# Altium footprint library General.PcbLib: 446 footprints (part 16 of 28)
Each footprint in its own frame and in the unit in brackets; x right, y up, seen from the top. Pads: shape width x height; smd on the part's side, far side on the other; paste and mask are expansions set on the pad; w line width, h text height; cw(c..) or ccw(c..) is an arc to the next point about the centre after c.
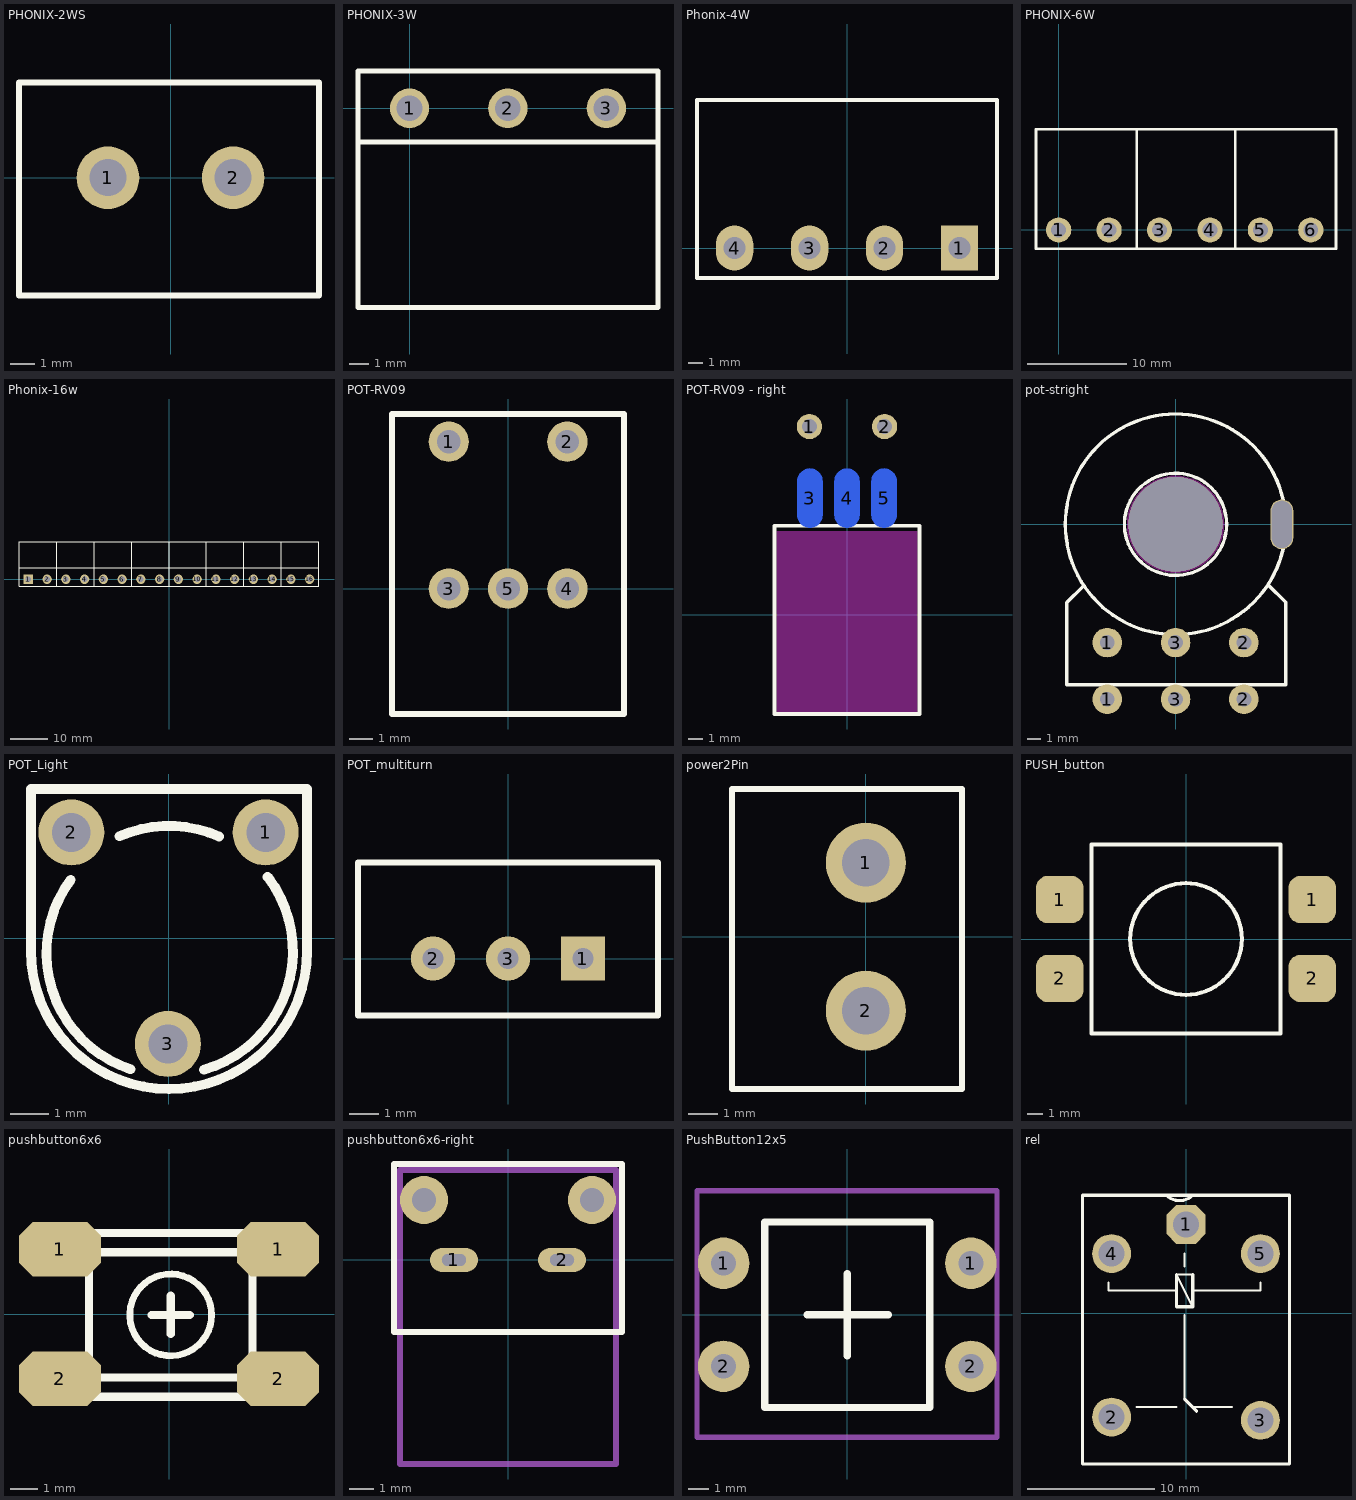
[diagram p15: the footprints below, top view; thin cyan lines are the x and y axes]

## PHONIX-2WS [mm] "stright"
pads (2):
  round 2.54 hole 1.5: 1(-2.54,0) 2(2.54,0)
Top Overlay:
  lines w0.254: -6.147,-4.775 -6.147,3.861 6.02,3.861 6.02,-4.775 -6.147,-4.775
3D body "phonix2w.stp": height 12, standoff -3.9, extent -6.089,-4.764 6.071,3.836

## PHONIX-3W [mm]
pads (3):
  round 2 hole 1.3: 1(0,0) 2(5,0) 3(10,0)
Top Overlay:
  lines w0.254: -2.616,-1.727 -2.616,-1.702 12.624,-1.702 ; -2.616,-10.109 12.624,-10.109 12.624,1.905 -2.616,1.905 -2.616,-10.109
3D body "User Library-Phoenix Contact MSTB-2_5_3G.STEP": height 8.7, standoff -3.4, extent -2.62,-10.1 12.62,1.9

## Phonix-4W [mm] "green2 part"
pads (4):
  rect 2.54x3.048 hole 1.5: 1(7.62,0)
  oval 2.54x3.048 hole 1.5: 2(2.54,0) 3(-2.54,0) 4(-7.62,0)
Top Overlay:
  lines w0.254: -10.16,-2.032 -10.16,10.033 10.16,10.033 10.16,-2.032 -10.16,-2.032
3D body "User Library-Green 4w Socket 5_08mm.step": height 16.1, standoff 0.5, extent -10.12,1.539 10.12,19.939
3D body "User Library-MSTB 2,5-4-G-5,08 1759033.STEP": height 8.6, standoff -3.5, extent -10.16,-1.969 10.16,10.033

## PHONIX-6W [mm]
pads (6):
  round 2.54 hole 1.5: 1(0,0) 2(5.08,0) 3(10.16,0) 4(15.24,0) 5(20.32,0) 6(25.4,0)
Top Overlay:
  lines w0.254: 7.874,-1.905 7.874,10.16 ; 17.78,-1.905 17.78,10.16 ; -2.286,-1.905 -2.286,10.16 27.94,10.16 27.94,-1.905 -2.159,-1.905 -2.286,-1.905
3D body "User Library-MSTB 2,5-2-G 1754436.STEP": height 3, standoff -9.1, extent 17.831,-1.936 27.831,10.064
3D body "User Library-MSTB 2,5-2-G 1754436.STEP": height 3, standoff -9.1, extent 7.823,-1.936 17.823,10.064
3D body "User Library-MSTB 2,5-2-G 1754436.STEP": height 3, standoff -9.1, extent -2.177,-1.936 7.823,10.064

## Phonix-16w [mm]
pads (16):
  rect 2.54x2.54 hole 1.5: 1(-38.1,0)
  round 2.54 hole 1.5: 2(-33.02,0) 3(-27.94,0) 4(-22.86,0) 5(-17.78,0) 6(-12.7,0) 7(-7.62,0) 8(-2.54,0) 9(2.54,0) 10(7.62,0) 11(12.7,0) 12(17.78,0) 13(22.86,0) 14(27.94,0) 15(33.02,0) 16(38.1,0)
Top Overlay:
  lines w0.254: -40.64,3.175 40.64,3.175 ; -30.48,-1.905 -30.48,10.16 ; -20.32,-1.905 -20.32,10.16 ; -10.16,-1.905 -10.16,10.16 ; 0,-1.905 0,10.16 ; 10.16,-1.905 10.16,10.16 ; 20.32,-1.905 20.32,10.16 ; 30.48,-1.905 30.48,10.16 ; -40.64,-1.905 40.64,-1.905 40.64,10.16 -40.64,10.16 -40.64,-1.905
3D body "User Library-MSTB 2,5-2-G 1754436.STEP": height 3, standoff -9.1, extent -20.211,-1.936 -10.211,10.064
3D body "User Library-MSTB 2,5-2-G 1754436.STEP": height 3, standoff -9.1, extent -30.353,-1.961 -20.353,10.039
3D body "User Library-MSTB 2,5-2-G 1754436.STEP": height 3, standoff -9.1, extent -40.513,-1.961 -30.513,10.039
3D body "User Library-MSTB 2,5-2-G 1754436.STEP": height 3, standoff -9.1, extent 10.218,-1.936 20.218,10.064
3D body "User Library-MSTB 2,5-2-G 1754436.STEP": height 3, standoff -9.1, extent 0.055,-1.956 10.055,10.044
3D body "User Library-MSTB 2,5-2-G 1754436.STEP": height 3, standoff -9.1, extent -10.051,-1.961 -0.051,10.039
3D body "User Library-MSTB 2,5-2-G 1754436.STEP": height 3, standoff -9.1, extent 30.607,-1.936 40.607,10.064
3D body "User Library-MSTB 2,5-2-G 1754436.STEP": height 3, standoff -9.1, extent 20.429,-1.936 30.429,10.064

## POT-RV09 [mm]
pads (5):
  round 1.7 hole 1: 1(-2.5,6.2) 2(2.5,6.2) 3(-2.5,0) 4(2.5,0) 5(0,0)
Top Overlay:
  lines w0.254: -4.891,-5.283 -4.891,7.366 4.888,7.366 4.888,-5.283 -4.891,-5.283
3D body "Potentiometerquad-09-1.STEP": height 11.35, standoff -3.5, extent -4.742,-19.934 4.763,7.366

## POT-RV09 - right [mm]
pads (5):
  round 1.7 hole 1: 1(-2.54,12.7) 2(2.54,12.7)
  oval 1.7x4 smd far side: 3(-2.5,7.875) 4(0,7.875) 5(2.5,7.875)
Top Overlay:
  lines w0.254: -4.9,-6.7 -4.9,6 4.9,6 4.9,-6.7 -4.9,-6.7
Keep-Out Layer:
  board cut-out: -4.75,-6.6 4.75,-6.6 4.75,5.625 -4.75,5.625
3D body "Potentiometerquad-09-1.STEP": height 6.7, standoff -20.6, extent -4.73,-5.367 4.775,9.483

## pot-stright [mm]
pads (7):
  round 2.2 hole 1.1: 1(-5.08,-13) 1(-5.08,-8.79) 2(5.08,-13) 2(5.08,-8.79) 3(0,-13) 3(0,-8.79)
  oval 1.7x3.7 hole 1.5 slot 3.5 at 90 deg: ""(7.9,0)
via 0,0 diameter 7 hole 7
Top Overlay:
  circle w0.254: c0,0 r8.2
  circle w0.254: c0,0 r3.8
  lines w0.254: -6.833,-4.593 -6.858,-4.593 -8.077,-5.812 -8.077,-11.933 8.179,-11.933 8.179,-5.786 6.871,-4.478
Keep-Out Layer:
  circle w0.254: c0,0 r3.5
3D body "Potentiometer-3.step": height 9, standoff -19.7, extent -8.424,-16.72 8.576,8.264
3D body "header-5.08-3w .stp": height 15.12, standoff -3.93, extent -7.495,-11.965 7.495,-5.615

## POT_Light [mm]
pads (3):
  round 1.7 hole 1: 1(2.502,2.722) 2(-2.502,2.722)
  round 1.7 hole 1 paste+0: 3(-0.014,-2.722)
Top Overlay:
  lines w0.254: -2.516,1.505 ccw(c0.014,-0.379) -0.978,-3.374 ; -1.269,2.623 cw(c0.013,-0.326) 1.304,2.619 ; 0.91,-3.385 ccw(c0.036,-0.341) 2.553,1.579 ; -3.543,-0.326 ccw(c0.013,-0.326) 3.569,-0.326 3.569,3.23 3.569,3.84 -3.543,3.84 -3.543,3.23 -3.543,-0.326
3D body "User Library-Trimmer, 3306F-1.STEP": height 7.62, standoff -3.04, extent -3.354,-3.35 3.456,4.902

## POT_multiturn [mm]
pads (3):
  rect 1.5x1.5 hole 0.7: 1(2.54,0)
  round 1.5 hole 0.7: 2(-2.54,0) 3(0,0)
Top Overlay:
  lines w0.2: -5.08,-1.93 -5.08,0 -5.08,3.251 5.08,3.251 5.08,-1.93 -5.08,-1.93
3D body "User Library-multi turn.step": height 12.57, standoff -2.16, extent -5.08,-1.93 5.08,3.15

## power2Pin [mm]
pads (2):
  round 2.7 hole 1.6: 1(0,2.5) 2(0,-2.5)
Top Overlay:
  lines w0.2: -4.521,-5.145 -4.521,4.989 3.251,4.989 3.251,-5.145 -4.521,-5.145
3D body "2-pin terminal block 5_0mm.step": height 10, standoff -3.5, extent -4.377,-5.685 3.073,4.995

## PUSH_button [mm] "12x12 smd flat"
pads (4):
  rrect50% 3x3 smd: 1(-8,2.5) 1(8,2.5) 2(-8,-2.5) 2(8,-2.5)
Top Overlay:
  circle w0.254: c0,0 r3.536
  lines w0.254: -6,-6 6,-6 6,6 -6,6 -6,-6
3D body "SWT_12x12_SMD.step": height 4, standoff 0, extent -6.731,-6 6.719,6

## pushbutton6x6 [mm]
pads (4):
  oct 3x2 smd: 1(-4,2.375) 1(4,2.375) 2(-4,-2.375) 2(4,-2.375)
Top Overlay:
  circle w0.25: c0.061,-0.034 r1.5
  lines w0.3: -3.464,-2.334 3.561,-2.334 ; -3.464,2.266 3.561,2.266 ; -0.639,-0.034 0.761,-0.034 ; 0.061,-0.734 0.061,0.666 ; -2.939,-3.034 3.061,-3.034 3.061,2.966 -2.939,2.966 -2.939,-3.034
3D body "User Library-KFC-A06-HA-4_3.STEP": height 4.3, standoff 0, extent -4.397,-2.999 4.603,3.001

## pushbutton6x6-right [mm]
pads (4):
  oval 2x1 hole 0.5 slot 1 at 0 deg: 1(-2.25,0) 2(2.25,0)
  round 2 hole 1 unplated: ""(-3.5,2.5) ""(3.5,2.5)
Top Overlay:
  lines w0.254: -4.75,-3 -4.75,4 4.75,4 4.75,-3 -4.75,-3
Mechanical 15:
  lines w0.254: -4.5,-8.5 4.5,-8.5 4.5,3.75 -4.5,3.75 -4.5,-8.5
3D body "pushbtn-6x6right.stp": height 7, standoff -3.52, extent -4.168,-8.356 4.24,4.001

## PushButton12x5 [mm]
pads (4):
  round 2.5 hole 1.2: 1(-6,2.5) 1(6,2.5) 2(-6,-2.5) 2(6,-2.5)
Top Overlay:
  lines w0.349: -1.956,0 2,0 ; 0,-2 0,2 ; -4,-4.5 4,-4.5 4,4.5 2,4.5 -4,4.5 -4,-4.5
Mechanical 15:
  lines w0.254: -7.29,-5.944 -7.29,6.02 -7.061,6.02 6.909,6.02 7.264,6.02 7.264,-5.944 -7.29,-5.944
3D body "User Library-tact switch 12x12x8mm.step": height 8.5, standoff -3.5, extent -6.96,-6 6.909,6
3D body: height 7, standoff -10, extent -6,2.5 -6,2.5

## rel [mil]
pads (5):
  oct 120x120 hole 80: 1(-0.5,274.5)
  round 120 hole 80: 2(-230.5,-320.5) 3(229.5,-330.5) 4(-230.5,184.5) 5(229.5,184.5)
Top Overlay:
  lines w6: -240,95.09 -240,70.09 -30,70.09 ; -153,-289.91 -30,-289.91 ; -5,-264.91 -5,-4.91 ; -5,145.09 -5,185.09 ; 20,-289.91 142,-289.91 ; 20,20.09 -30,120.09 20,120.09 ; 20,70.09 230,70.09 230,95.09
  lines w10: -60.5,364.5 ccw(c-20.5,404.5) 19.5,364.5 ; -30,120.09 -30,70.09 -30,20.09 20,20.09 20,70.09 20,120.09 ; -5,-264.91 20,-289.91 32,-302.91 ; -320.5,-465.5 -320.5,364.5 319.5,364.5 319.5,-465.5 -320.5,-465.5